# Altium schematic symbol library jlcpcb_2025_04_capacitors_extended_0402.schlib: 3594 symbols (part 11 of 20)
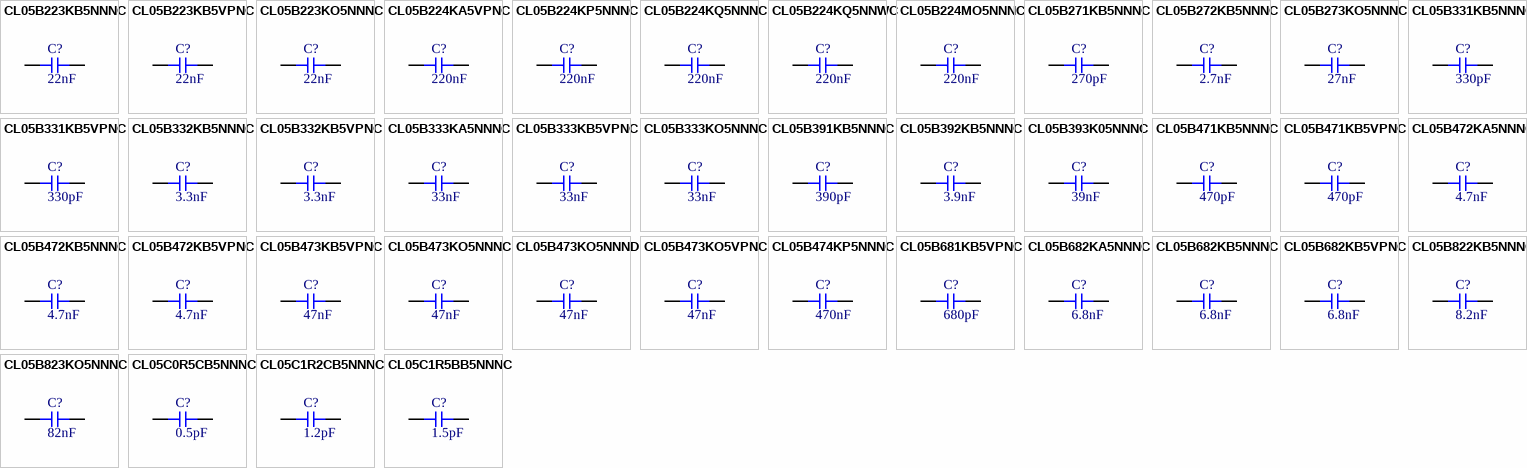
[diagram p99: symbols CL05B223KB5NNNC to CL05C1R5BB5NNNC]

## CL05B472KA5NNNC
designator C?  Capacitance: 4.7nF  (hidden comment: *)
Capacitor, Ceramic (MLCC), 4.7nF, ±10%, 25V, X7R, ±10%, SMD 0402; Manufacturer: Samsung Electro-Mechanics; Manufacturer Part Number: CL05B472KA5NNNC; Package Size: 0402; JLCPCB Basic Part: No; JLCPCB Part Number: C377749; Supplier 1: LCSC; Category: Capacitors - MLCC; Supplier Part Number 1: C377749; Tolerance: ±10%; Voltage Rating: 25V; Temperature Coefficient: X7R; RoHS: Yes; ComponentLink1Description: Datasheet; ComponentLink1URL: https://wmsc.lcsc.com/wmsc/upload/file/pdf/v2/lcsc/2304140030_Samsung-Electro-Mechanics-CL05B472KA5NNNC_C377749.pdf; ComponentLink2Description: JLCPCB Part URL; ComponentLink2URL: https://jlcpcb.com/partdetail/C377749; ComponentLink3Description: LCSC Part URL; ComponentLink3URL: https://lcsc.com/product-detail/Multilayer-Ceramic-Capacitors-MLCC---SMD-SMT_Samsung-Electro-Mechanics-Samsung-Electro-Mechanics-CL05B472KA5NNNC_C377749.html; ComponentLink4Description: Samsung Component Library; ComponentLink4URL: https://weblib.samsungsem.com/mlcc/mlcc-ec.do?partNumber=CL05B472KA5NNN
footprint CAP-0402 (0402 (1005M) Capacitor)
pins: 1, 2

## CL05B472KB5NNNC
designator C?  Capacitance: 4.7nF  (hidden comment: *)
Capacitor, Ceramic (MLCC), 4.7nF, ±10%, 50V, X7R, ±10%, SMD 0402; Manufacturer: Samsung Electro-Mechanics; Manufacturer Part Number: CL05B472KB5NNNC; Package Size: 0402; JLCPCB Basic Part: No; JLCPCB Part Number: C84705; Supplier 1: LCSC; Category: Capacitors - MLCC; Supplier Part Number 1: C84705; Tolerance: ±10%; Voltage Rating: 50V; Temperature Coefficient: X7R; RoHS: Yes; ComponentLink1Description: Datasheet; ComponentLink1URL: https://wmsc.lcsc.com/wmsc/upload/file/pdf/v2/lcsc/2304140030_Samsung-Electro-Mechanics-CL05B472KB5NNNC_C84705.pdf; ComponentLink2Description: JLCPCB Part URL; ComponentLink2URL: https://jlcpcb.com/partdetail/C84705; ComponentLink3Description: LCSC Part URL; ComponentLink3URL: https://lcsc.com/product-detail/Multilayer-Ceramic-Capacitors-MLCC---SMD-SMT_Samsung-Electro-Mechanics-Samsung-Electro-Mechanics-CL05B472KB5NNNC_C84705.html; ComponentLink4Description: Samsung Component Library; ComponentLink4URL: https://weblib.samsungsem.com/mlcc/mlcc-ec.do?partNumber=CL05B472KB5NNN
footprint CAP-0402 (0402 (1005M) Capacitor)
pins: 1, 2

## CL05B472KB5VPNC
designator C?  Capacitance: 4.7nF  (hidden comment: *)
Capacitor, Ceramic (MLCC), 4.7nF, ±10%, 50V, X7R, ±10%, SMD 0402; Manufacturer: Samsung Electro-Mechanics; Manufacturer Part Number: CL05B472KB5VPNC; Package Size: 0402; JLCPCB Basic Part: No; JLCPCB Part Number: C307338; Supplier 1: LCSC; Category: Capacitors - MLCC; Supplier Part Number 1: C307338; Tolerance: ±10%; Voltage Rating: 50V; Temperature Coefficient: X7R; RoHS: Yes; ComponentLink1Description: Datasheet; ComponentLink1URL: https://wmsc.lcsc.com/wmsc/upload/file/pdf/v2/lcsc/2304140030_Samsung-Electro-Mechanics-CL05B472KB5VPNC_C307338.pdf; ComponentLink2Description: JLCPCB Part URL; ComponentLink2URL: https://jlcpcb.com/partdetail/C307338; ComponentLink3Description: LCSC Part URL; ComponentLink3URL: https://lcsc.com/product-detail/Multilayer-Ceramic-Capacitors-MLCC---SMD-SMT_Samsung-Electro-Mechanics-Samsung-Electro-Mechanics-CL05B472KB5VPNC_C307338.html; ComponentLink4Description: Samsung Component Library; ComponentLink4URL: https://weblib.samsungsem.com/mlcc/mlcc-ec.do?partNumber=CL05B472KB5VPN
footprint CAP-0402 (0402 (1005M) Capacitor)
pins: 1, 2

## CL05B473KB5VPNC
designator C?  Capacitance: 47nF  (hidden comment: *)
Capacitor, Ceramic (MLCC), 47nF, ±10%, 50V, X7R, ±10%, SMD 0402; Manufacturer: Samsung Electro-Mechanics; Manufacturer Part Number: CL05B473KB5VPNC; Package Size: 0402; JLCPCB Basic Part: No; JLCPCB Part Number: C307339; Supplier 1: LCSC; Category: Capacitors - MLCC; Supplier Part Number 1: C307339; Tolerance: ±10%; Voltage Rating: 50V; Temperature Coefficient: X7R; RoHS: Yes; ComponentLink1Description: Datasheet; ComponentLink1URL: https://wmsc.lcsc.com/wmsc/upload/file/pdf/v2/lcsc/2304140030_Samsung-Electro-Mechanics-CL05B473KB5VPNC_C307339.pdf; ComponentLink2Description: JLCPCB Part URL; ComponentLink2URL: https://jlcpcb.com/partdetail/C307339; ComponentLink3Description: LCSC Part URL; ComponentLink3URL: https://lcsc.com/product-detail/Multilayer-Ceramic-Capacitors-MLCC---SMD-SMT_Samsung-Electro-Mechanics-Samsung-Electro-Mechanics-CL05B473KB5VPNC_C307339.html; ComponentLink4Description: Samsung Component Library; ComponentLink4URL: https://weblib.samsungsem.com/mlcc/mlcc-ec.do?partNumber=CL05B473KB5VPN
footprint CAP-0402 (0402 (1005M) Capacitor)
pins: 1, 2

## CL05B473KO5NNNC
designator C?  Capacitance: 47nF  (hidden comment: *)
Capacitor, Ceramic (MLCC), 47nF, ±10%, 16V, X7R, ±10%, SMD 0402; Manufacturer: Samsung Electro-Mechanics; Manufacturer Part Number: CL05B473KO5NNNC; Package Size: 0402; JLCPCB Basic Part: No; JLCPCB Part Number: C307434; Supplier 1: LCSC; Category: Capacitors - MLCC; Supplier Part Number 1: C307434; Tolerance: ±10%; Voltage Rating: 16V; Temperature Coefficient: X7R; RoHS: Yes; ComponentLink1Description: Datasheet; ComponentLink1URL: https://wmsc.lcsc.com/wmsc/upload/file/pdf/v2/lcsc/2304140030_Samsung-Electro-Mechanics-CL05B473KO5NNNC_C307434.pdf; ComponentLink2Description: JLCPCB Part URL; ComponentLink2URL: https://jlcpcb.com/partdetail/C307434; ComponentLink3Description: LCSC Part URL; ComponentLink3URL: https://lcsc.com/product-detail/Multilayer-Ceramic-Capacitors-MLCC---SMD-SMT_Samsung-Electro-Mechanics-Samsung-Electro-Mechanics-CL05B473KO5NNNC_C307434.html; ComponentLink4Description: Samsung Component Library; ComponentLink4URL: https://weblib.samsungsem.com/mlcc/mlcc-ec.do?partNumber=CL05B473KO5NNN
footprint CAP-0402 (0402 (1005M) Capacitor)
pins: 1, 2

## CL05B473KO5NNND
designator C?  Capacitance: 47nF  (hidden comment: *)
Capacitor, Ceramic (MLCC), 47nF, ±10%, 16V, X7R, ±10%, SMD 0402; Manufacturer: Samsung Electro-Mechanics; Manufacturer Part Number: CL05B473KO5NNND; Package Size: 0402; JLCPCB Basic Part: No; JLCPCB Part Number: C377750; Supplier 1: LCSC; Category: Capacitors - MLCC; Supplier Part Number 1: C377750; Tolerance: ±10%; Voltage Rating: 16V; Temperature Coefficient: X7R; RoHS: Yes; ComponentLink1Description: Datasheet; ComponentLink1URL: https://wmsc.lcsc.com/wmsc/upload/file/pdf/v2/lcsc/2304140030_Samsung-Electro-Mechanics-CL05B473KO5NNND_C377750.pdf; ComponentLink2Description: JLCPCB Part URL; ComponentLink2URL: https://jlcpcb.com/partdetail/C377750; ComponentLink3Description: LCSC Part URL; ComponentLink3URL: https://lcsc.com/product-detail/Multilayer-Ceramic-Capacitors-MLCC---SMD-SMT_Samsung-Electro-Mechanics-Samsung-Electro-Mechanics-CL05B473KO5NNND_C377750.html; ComponentLink4Description: Samsung Component Library; ComponentLink4URL: https://weblib.samsungsem.com/mlcc/mlcc-ec.do?partNumber=CL05B473KO5NNN
footprint CAP-0402 (0402 (1005M) Capacitor)
pins: 1, 2

## CL05B473KO5VPNC
designator C?  Capacitance: 47nF  (hidden comment: *)
Capacitor, Ceramic (MLCC), 47nF, ±10%, 16V, X7R, ±10%, SMD 0402; Manufacturer: Samsung Electro-Mechanics; Manufacturer Part Number: CL05B473KO5VPNC; Package Size: 0402; JLCPCB Basic Part: No; JLCPCB Part Number: C472440; Supplier 1: LCSC; Category: Capacitors - MLCC; Supplier Part Number 1: C472440; Tolerance: ±10%; Voltage Rating: 16V; Temperature Coefficient: X7R; RoHS: Yes; ComponentLink1Description: Datasheet; ComponentLink1URL: https://wmsc.lcsc.com/wmsc/upload/file/pdf/v2/lcsc/2304140030_Samsung-Electro-Mechanics-CL05B473KO5VPNC_C472440.pdf; ComponentLink2Description: JLCPCB Part URL; ComponentLink2URL: https://jlcpcb.com/partdetail/C472440; ComponentLink3Description: LCSC Part URL; ComponentLink3URL: https://lcsc.com/product-detail/Multilayer-Ceramic-Capacitors-MLCC---SMD-SMT_Samsung-Electro-Mechanics-Samsung-Electro-Mechanics-CL05B473KO5VPNC_C472440.html; ComponentLink4Description: Samsung Component Library; ComponentLink4URL: https://weblib.samsungsem.com/mlcc/mlcc-ec.do?partNumber=CL05B473KO5VPN
footprint CAP-0402 (0402 (1005M) Capacitor)
pins: 1, 2

## CL05B474KP5NNNC
designator C?  Capacitance: 470nF  (hidden comment: *)
Capacitor, Ceramic (MLCC), 470nF, ±10%, 10V, X7R, ±10%, SMD 0402; Manufacturer: Samsung Electro-Mechanics; Manufacturer Part Number: CL05B474KP5NNNC; Package Size: 0402; JLCPCB Basic Part: No; JLCPCB Part Number: C2895720; Supplier 1: LCSC; Category: Capacitors - MLCC; Supplier Part Number 1: C2895720; Tolerance: ±10%; Voltage Rating: 10V; Temperature Coefficient: X7R; RoHS: Yes; ComponentLink1Description: Datasheet; ComponentLink1URL: https://wmsc.lcsc.com/wmsc/upload/file/pdf/v2/lcsc/2202132100_Samsung-Electro-Mechanics-CL05B474KP5NNNC_C2895720.pdf; ComponentLink2Description: JLCPCB Part URL; ComponentLink2URL: https://jlcpcb.com/partdetail/C2895720; ComponentLink3Description: LCSC Part URL; ComponentLink3URL: https://lcsc.com/product-detail/Multilayer-Ceramic-Capacitors-MLCC---SMD-SMT_Samsung-Electro-Mechanics-Samsung-Electro-Mechanics-CL05B474KP5NNNC_C2895720.html; ComponentLink4Description: Samsung Component Library; ComponentLink4URL: https://weblib.samsungsem.com/mlcc/mlcc-ec.do?partNumber=CL05B474KP5NNN
footprint CAP-0402 (0402 (1005M) Capacitor)
pins: 1, 2

## CL05B681KB5VPNC
designator C?  Capacitance: 680pF  (hidden comment: *)
Capacitor, Ceramic (MLCC), 680pF, ±10%, 50V, X7R, ±10%, SMD 0402; Manufacturer: Samsung Electro-Mechanics; Manufacturer Part Number: CL05B681KB5VPNC; Package Size: 0402; JLCPCB Basic Part: No; JLCPCB Part Number: C472441; Supplier 1: LCSC; Category: Capacitors - MLCC; Supplier Part Number 1: C472441; Tolerance: ±10%; Voltage Rating: 50V; Temperature Coefficient: X7R; RoHS: Yes; ComponentLink1Description: Datasheet; ComponentLink1URL: https://wmsc.lcsc.com/wmsc/upload/file/pdf/v2/lcsc/2304140030_Samsung-Electro-Mechanics-CL05B681KB5VPNC_C472441.pdf; ComponentLink2Description: JLCPCB Part URL; ComponentLink2URL: https://jlcpcb.com/partdetail/C472441; ComponentLink3Description: LCSC Part URL; ComponentLink3URL: https://lcsc.com/product-detail/Multilayer-Ceramic-Capacitors-MLCC---SMD-SMT_Samsung-Electro-Mechanics-Samsung-Electro-Mechanics-CL05B681KB5VPNC_C472441.html; ComponentLink4Description: Samsung Component Library; ComponentLink4URL: https://weblib.samsungsem.com/mlcc/mlcc-ec.do?partNumber=CL05B681KB5VPN
footprint CAP-0402 (0402 (1005M) Capacitor)
pins: 1, 2

## CL05B682KA5NNNC
designator C?  Capacitance: 6.8nF  (hidden comment: *)
Capacitor, Ceramic (MLCC), 6.8nF, ±10%, 25V, X7R, ±10%, SMD 0402; Manufacturer: Samsung Electro-Mechanics; Manufacturer Part Number: CL05B682KA5NNNC; Package Size: 0402; JLCPCB Basic Part: No; JLCPCB Part Number: C318630; Supplier 1: LCSC; Category: Capacitors - MLCC; Supplier Part Number 1: C318630; Tolerance: ±10%; Voltage Rating: 25V; Temperature Coefficient: X7R; RoHS: Yes; ComponentLink1Description: Datasheet; ComponentLink1URL: https://wmsc.lcsc.com/wmsc/upload/file/pdf/v2/lcsc/2304140030_Samsung-Electro-Mechanics-CL05B682KA5NNNC_C318630.pdf; ComponentLink2Description: JLCPCB Part URL; ComponentLink2URL: https://jlcpcb.com/partdetail/C318630; ComponentLink3Description: LCSC Part URL; ComponentLink3URL: https://lcsc.com/product-detail/Multilayer-Ceramic-Capacitors-MLCC---SMD-SMT_Samsung-Electro-Mechanics-Samsung-Electro-Mechanics-CL05B682KA5NNNC_C318630.html; ComponentLink4Description: Samsung Component Library; ComponentLink4URL: https://weblib.samsungsem.com/mlcc/mlcc-ec.do?partNumber=CL05B682KA5NNN
footprint CAP-0402 (0402 (1005M) Capacitor)
pins: 1, 2

## CL05B682KB5NNNC
designator C?  Capacitance: 6.8nF  (hidden comment: *)
Capacitor, Ceramic (MLCC), 6.8nF, ±10%, 50V, X7R, ±10%, SMD 0402; Manufacturer: Samsung Electro-Mechanics; Manufacturer Part Number: CL05B682KB5NNNC; Package Size: 0402; JLCPCB Basic Part: No; JLCPCB Part Number: C318580; Supplier 1: LCSC; Category: Capacitors - MLCC; Supplier Part Number 1: C318580; Tolerance: ±10%; Voltage Rating: 50V; Temperature Coefficient: X7R; RoHS: Yes; ComponentLink1Description: Datasheet; ComponentLink1URL: https://wmsc.lcsc.com/wmsc/upload/file/pdf/v2/lcsc/2309061404_Samsung-Electro-Mechanics-CL05B682KB5NNNC_C318580.pdf; ComponentLink2Description: JLCPCB Part URL; ComponentLink2URL: https://jlcpcb.com/partdetail/C318580; ComponentLink3Description: LCSC Part URL; ComponentLink3URL: https://lcsc.com/product-detail/Multilayer-Ceramic-Capacitors-MLCC---SMD-SMT_Samsung-Electro-Mechanics-Samsung-Electro-Mechanics-CL05B682KB5NNNC_C318580.html; ComponentLink4Description: Samsung Component Library; ComponentLink4URL: https://weblib.samsungsem.com/mlcc/mlcc-ec.do?partNumber=CL05B682KB5NNN
footprint CAP-0402 (0402 (1005M) Capacitor)
pins: 1, 2

## CL05B682KB5VPNC
designator C?  Capacitance: 6.8nF  (hidden comment: *)
Capacitor, Ceramic (MLCC), 6.8nF, ±10%, 50V, X7R, ±10%, SMD 0402; Manufacturer: Samsung Electro-Mechanics; Manufacturer Part Number: CL05B682KB5VPNC; Package Size: 0402; JLCPCB Basic Part: No; JLCPCB Part Number: C3840335; Supplier 1: LCSC; Category: Capacitors - MLCC; Supplier Part Number 1: C3840335; Tolerance: ±10%; Voltage Rating: 50V; Temperature Coefficient: X7R; RoHS: Yes; ComponentLink1Description: Datasheet; ComponentLink1URL: https://wmsc.lcsc.com/wmsc/upload/file/pdf/v2/lcsc/2309061135_Samsung-Electro-Mechanics-CL05B682KB5VPNC_C3840335.pdf; ComponentLink2Description: JLCPCB Part URL; ComponentLink2URL: https://jlcpcb.com/partdetail/C3840335; ComponentLink3Description: LCSC Part URL; ComponentLink3URL: https://lcsc.com/product-detail/Multilayer-Ceramic-Capacitors-MLCC---SMD-SMT_Samsung-Electro-Mechanics-Samsung-Electro-Mechanics-CL05B682KB5VPNC_C3840335.html; ComponentLink4Description: Samsung Component Library; ComponentLink4URL: https://weblib.samsungsem.com/mlcc/mlcc-ec.do?partNumber=CL05B682KB5VPN
footprint CAP-0402 (0402 (1005M) Capacitor)
pins: 1, 2

## CL05B822KB5NNNC
designator C?  Capacitance: 8.2nF  (hidden comment: *)
Capacitor, Ceramic (MLCC), 8.2nF, ±10%, 50V, X7R, ±10%, SMD 0402; Manufacturer: Samsung Electro-Mechanics; Manufacturer Part Number: CL05B822KB5NNNC; Package Size: 0402; JLCPCB Basic Part: No; JLCPCB Part Number: C307436; Supplier 1: LCSC; Category: Capacitors - MLCC; Supplier Part Number 1: C307436; Tolerance: ±10%; Voltage Rating: 50V; Temperature Coefficient: X7R; RoHS: Yes; ComponentLink1Description: Datasheet; ComponentLink1URL: https://wmsc.lcsc.com/wmsc/upload/file/pdf/v2/lcsc/2304140030_Samsung-Electro-Mechanics-CL05B822KB5NNNC_C307436.pdf; ComponentLink2Description: JLCPCB Part URL; ComponentLink2URL: https://jlcpcb.com/partdetail/C307436; ComponentLink3Description: LCSC Part URL; ComponentLink3URL: https://lcsc.com/product-detail/Multilayer-Ceramic-Capacitors-MLCC---SMD-SMT_Samsung-Electro-Mechanics-Samsung-Electro-Mechanics-CL05B822KB5NNNC_C307436.html; ComponentLink4Description: Samsung Component Library; ComponentLink4URL: https://weblib.samsungsem.com/mlcc/mlcc-ec.do?partNumber=CL05B822KB5NNN
footprint CAP-0402 (0402 (1005M) Capacitor)
pins: 1, 2

## CL05B823KO5NNNC
designator C?  Capacitance: 82nF  (hidden comment: *)
Capacitor, Ceramic (MLCC), 82nF, ±10%, 16V, X7R, ±10%, SMD 0402; Manufacturer: Samsung Electro-Mechanics; Manufacturer Part Number: CL05B823KO5NNNC; Package Size: 0402; JLCPCB Basic Part: No; JLCPCB Part Number: C307437; Supplier 1: LCSC; Category: Capacitors - MLCC; Supplier Part Number 1: C307437; Tolerance: ±10%; Voltage Rating: 16V; Temperature Coefficient: X7R; RoHS: Yes; ComponentLink1Description: Datasheet; ComponentLink1URL: https://wmsc.lcsc.com/wmsc/upload/file/pdf/v2/lcsc/2304140030_Samsung-Electro-Mechanics-CL05B823KO5NNNC_C307437.pdf; ComponentLink2Description: JLCPCB Part URL; ComponentLink2URL: https://jlcpcb.com/partdetail/C307437; ComponentLink3Description: LCSC Part URL; ComponentLink3URL: https://lcsc.com/product-detail/Multilayer-Ceramic-Capacitors-MLCC---SMD-SMT_Samsung-Electro-Mechanics-Samsung-Electro-Mechanics-CL05B823KO5NNNC_C307437.html; ComponentLink4Description: Samsung Component Library; ComponentLink4URL: https://weblib.samsungsem.com/mlcc/mlcc-ec.do?partNumber=CL05B823KO5NNN
footprint CAP-0402 (0402 (1005M) Capacitor)
pins: 1, 2

## CL05C0R5CB5NNNC
designator C?  Capacitance: 0.5pF  (hidden comment: *)
Capacitor, Ceramic (MLCC), 0.5pF, 50V, C0G, SMD 0402; Manufacturer: Samsung Electro-Mechanics; Manufacturer Part Number: CL05C0R5CB5NNNC; Package Size: 0402; JLCPCB Basic Part: No; JLCPCB Part Number: C86284; Supplier 1: LCSC; Category: Capacitors - MLCC; Supplier Part Number 1: C86284; Voltage Rating: 50V; Temperature Coefficient: C0G; RoHS: Yes; ComponentLink1Description: Datasheet; ComponentLink1URL: https://wmsc.lcsc.com/wmsc/upload/file/pdf/v2/lcsc/2304140030_Samsung-Electro-Mechanics-CL05C0R5CB5NNNC_C86284.pdf; ComponentLink2Description: JLCPCB Part URL; ComponentLink2URL: https://jlcpcb.com/partdetail/C86284; ComponentLink3Description: LCSC Part URL; ComponentLink3URL: https://lcsc.com/product-detail/Multilayer-Ceramic-Capacitors-MLCC---SMD-SMT_Samsung-Electro-Mechanics-Samsung-Electro-Mechanics-CL05C0R5CB5NNNC_C86284.html; ComponentLink4Description: Samsung Component Library; ComponentLink4URL: https://weblib.samsungsem.com/mlcc/mlcc-ec.do?partNumber=CL05C0R5CB5NNN
footprint CAP-0402 (0402 (1005M) Capacitor)
pins: 1, 2

## CL05C1R2CB5NNNC
designator C?  Capacitance: 1.2pF  (hidden comment: *)
Capacitor, Ceramic (MLCC), 1.2pF, 50V, C0G, SMD 0402; Manufacturer: Samsung Electro-Mechanics; Manufacturer Part Number: CL05C1R2CB5NNNC; Package Size: 0402; JLCPCB Basic Part: No; JLCPCB Part Number: C159808; Supplier 1: LCSC; Category: Capacitors - MLCC; Supplier Part Number 1: C159808; Voltage Rating: 50V; Temperature Coefficient: C0G; RoHS: Yes; ComponentLink1Description: Datasheet; ComponentLink1URL: https://wmsc.lcsc.com/wmsc/upload/file/pdf/v2/lcsc/2304140030_Samsung-Electro-Mechanics-CL05C1R2CB5NNNC_C159808.pdf; ComponentLink2Description: JLCPCB Part URL; ComponentLink2URL: https://jlcpcb.com/partdetail/C159808; ComponentLink3Description: LCSC Part URL; ComponentLink3URL: https://lcsc.com/product-detail/Multilayer-Ceramic-Capacitors-MLCC---SMD-SMT_Samsung-Electro-Mechanics-Samsung-Electro-Mechanics-CL05C1R2CB5NNNC_C159808.html; ComponentLink4Description: Samsung Component Library; ComponentLink4URL: https://weblib.samsungsem.com/mlcc/mlcc-ec.do?partNumber=CL05C1R2CB5NNN
footprint CAP-0402 (0402 (1005M) Capacitor)
pins: 1, 2

## CL05C1R5BB5NNNC
designator C?  Capacitance: 1.5pF  (hidden comment: *)
Capacitor, Ceramic (MLCC), 1.5pF, 50V, C0G, SMD 0402; Manufacturer: Samsung Electro-Mechanics; Manufacturer Part Number: CL05C1R5BB5NNNC; Package Size: 0402; JLCPCB Basic Part: No; JLCPCB Part Number: C2980160; Supplier 1: LCSC; Category: Capacitors - MLCC; Supplier Part Number 1: C2980160; Voltage Rating: 50V; Temperature Coefficient: C0G; RoHS: Yes; ComponentLink1Description: Datasheet; ComponentLink1URL: https://wmsc.lcsc.com/wmsc/upload/file/pdf/v2/lcsc/2203081130_Samsung-Electro-Mechanics-CL05C1R5BB5NNNC_C2980160.pdf; ComponentLink2Description: JLCPCB Part URL; ComponentLink2URL: https://jlcpcb.com/partdetail/C2980160; ComponentLink3Description: LCSC Part URL; ComponentLink3URL: https://lcsc.com/product-detail/Multilayer-Ceramic-Capacitors-MLCC---SMD-SMT_Samsung-Electro-Mechanics-Samsung-Electro-Mechanics-CL05C1R5BB5NNNC_C2980160.html; ComponentLink4Description: Samsung Component Library; ComponentLink4URL: https://weblib.samsungsem.com/mlcc/mlcc-ec.do?partNumber=CL05C1R5BB5NNN
footprint CAP-0402 (0402 (1005M) Capacitor)
pins: 1, 2

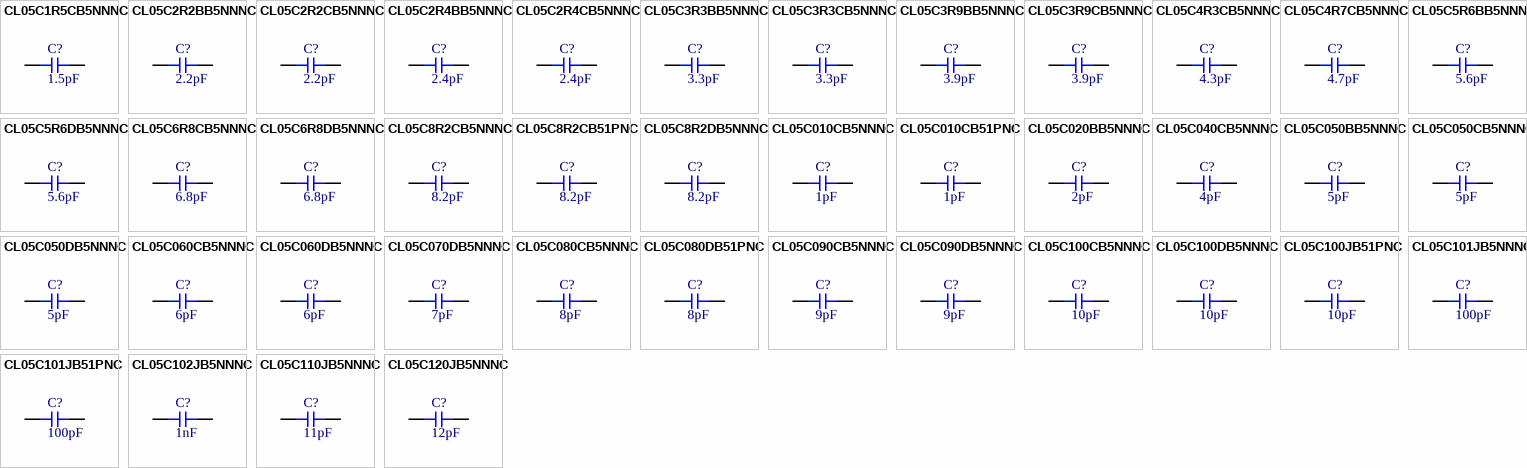
[diagram p47: symbols CL05C1R5CB5NNNC to CL05C120JB5NNNC]

## CL05C1R5CB5NNNC
designator C?  Capacitance: 1.5pF  (hidden comment: *)
Capacitor, Ceramic (MLCC), 1.5pF, 50V, C0G, SMD 0402; Manufacturer: Samsung Electro-Mechanics; Manufacturer Part Number: CL05C1R5CB5NNNC; Package Size: 0402; JLCPCB Basic Part: No; JLCPCB Part Number: C170150; Supplier 1: LCSC; Category: Capacitors - MLCC; Supplier Part Number 1: C170150; Voltage Rating: 50V; Temperature Coefficient: C0G; RoHS: Yes; ComponentLink1Description: Datasheet; ComponentLink1URL: https://wmsc.lcsc.com/wmsc/upload/file/pdf/v2/lcsc/2304140030_Samsung-Electro-Mechanics-CL05C1R5CB5NNNC_C170150.pdf; ComponentLink2Description: JLCPCB Part URL; ComponentLink2URL: https://jlcpcb.com/partdetail/C170150; ComponentLink3Description: LCSC Part URL; ComponentLink3URL: https://lcsc.com/product-detail/Multilayer-Ceramic-Capacitors-MLCC---SMD-SMT_Samsung-Electro-Mechanics-Samsung-Electro-Mechanics-CL05C1R5CB5NNNC_C170150.html; ComponentLink4Description: Samsung Component Library; ComponentLink4URL: https://weblib.samsungsem.com/mlcc/mlcc-ec.do?partNumber=CL05C1R5CB5NNN
footprint CAP-0402 (0402 (1005M) Capacitor)
pins: 1, 2

## CL05C2R2BB5NNNC
designator C?  Capacitance: 2.2pF  (hidden comment: *)
Capacitor, Ceramic (MLCC), 2.2pF, 50V, C0G, SMD 0402; Manufacturer: Samsung Electro-Mechanics; Manufacturer Part Number: CL05C2R2BB5NNNC; Package Size: 0402; JLCPCB Basic Part: No; JLCPCB Part Number: C307446; Supplier 1: LCSC; Category: Capacitors - MLCC; Supplier Part Number 1: C307446; Voltage Rating: 50V; Temperature Coefficient: C0G; RoHS: Yes; ComponentLink1Description: Datasheet; ComponentLink2Description: JLCPCB Part URL; ComponentLink2URL: https://jlcpcb.com/partdetail/C307446; ComponentLink3Description: LCSC Part URL; ComponentLink3URL: https://lcsc.com/product-detail/Multilayer-Ceramic-Capacitors-MLCC---SMD-SMT_Samsung-Electro-Mechanics-Samsung-Electro-Mechanics-CL05C2R2BB5NNNC_C307446.html; ComponentLink4Description: Samsung Component Library; ComponentLink4URL: https://weblib.samsungsem.com/mlcc/mlcc-ec.do?partNumber=CL05C2R2BB5NNN
footprint CAP-0402 (0402 (1005M) Capacitor)
pins: 1, 2

## CL05C2R2CB5NNNC
designator C?  Capacitance: 2.2pF  (hidden comment: *)
Capacitor, Ceramic (MLCC), 2.2pF, 50V, C0G, SMD 0402; Manufacturer: Samsung Electro-Mechanics; Manufacturer Part Number: CL05C2R2CB5NNNC; Package Size: 0402; JLCPCB Basic Part: No; JLCPCB Part Number: C159806; Supplier 1: LCSC; Category: Capacitors - MLCC; Supplier Part Number 1: C159806; Voltage Rating: 50V; Temperature Coefficient: C0G; RoHS: Yes; ComponentLink1Description: Datasheet; ComponentLink1URL: https://wmsc.lcsc.com/wmsc/upload/file/pdf/v2/lcsc/2304140030_Samsung-Electro-Mechanics-CL05C2R2CB5NNNC_C159806.pdf; ComponentLink2Description: JLCPCB Part URL; ComponentLink2URL: https://jlcpcb.com/partdetail/C159806; ComponentLink3Description: LCSC Part URL; ComponentLink3URL: https://lcsc.com/product-detail/Multilayer-Ceramic-Capacitors-MLCC---SMD-SMT_Samsung-Electro-Mechanics-Samsung-Electro-Mechanics-CL05C2R2CB5NNNC_C159806.html; ComponentLink4Description: Samsung Component Library; ComponentLink4URL: https://weblib.samsungsem.com/mlcc/mlcc-ec.do?partNumber=CL05C2R2CB5NNN
footprint CAP-0402 (0402 (1005M) Capacitor)
pins: 1, 2

## CL05C2R4BB5NNNC
designator C?  Capacitance: 2.4pF  (hidden comment: *)
Capacitor, Ceramic (MLCC), 2.4pF, 50V, C0G, SMD 0402; Manufacturer: Samsung Electro-Mechanics; Manufacturer Part Number: CL05C2R4BB5NNNC; Package Size: 0402; JLCPCB Basic Part: No; JLCPCB Part Number: C377751; Supplier 1: LCSC; Category: Capacitors - MLCC; Supplier Part Number 1: C377751; Voltage Rating: 50V; Temperature Coefficient: C0G; RoHS: Yes; ComponentLink1Description: Datasheet; ComponentLink1URL: https://wmsc.lcsc.com/wmsc/upload/file/pdf/v2/lcsc/2304140030_Samsung-Electro-Mechanics-CL05C2R4BB5NNNC_C377751.pdf; ComponentLink2Description: JLCPCB Part URL; ComponentLink2URL: https://jlcpcb.com/partdetail/C377751; ComponentLink3Description: LCSC Part URL; ComponentLink3URL: https://lcsc.com/product-detail/Multilayer-Ceramic-Capacitors-MLCC---SMD-SMT_Samsung-Electro-Mechanics-Samsung-Electro-Mechanics-CL05C2R4BB5NNNC_C377751.html; ComponentLink4Description: Samsung Component Library; ComponentLink4URL: https://weblib.samsungsem.com/mlcc/mlcc-ec.do?partNumber=CL05C2R4BB5NNN
footprint CAP-0402 (0402 (1005M) Capacitor)
pins: 1, 2

## CL05C2R4CB5NNNC
designator C?  Capacitance: 2.4pF  (hidden comment: *)
Capacitor, Ceramic (MLCC), 2.4pF, 50V, C0G, SMD 0402; Manufacturer: Samsung Electro-Mechanics; Manufacturer Part Number: CL05C2R4CB5NNNC; Package Size: 0402; JLCPCB Basic Part: No; JLCPCB Part Number: C318575; Supplier 1: LCSC; Category: Capacitors - MLCC; Supplier Part Number 1: C318575; Voltage Rating: 50V; Temperature Coefficient: C0G; RoHS: Yes; ComponentLink1Description: Datasheet; ComponentLink1URL: https://wmsc.lcsc.com/wmsc/upload/file/pdf/v2/lcsc/2304140030_Samsung-Electro-Mechanics-CL05C2R4CB5NNNC_C318575.pdf; ComponentLink2Description: JLCPCB Part URL; ComponentLink2URL: https://jlcpcb.com/partdetail/C318575; ComponentLink3Description: LCSC Part URL; ComponentLink3URL: https://lcsc.com/product-detail/Multilayer-Ceramic-Capacitors-MLCC---SMD-SMT_Samsung-Electro-Mechanics-Samsung-Electro-Mechanics-CL05C2R4CB5NNNC_C318575.html; ComponentLink4Description: Samsung Component Library; ComponentLink4URL: https://weblib.samsungsem.com/mlcc/mlcc-ec.do?partNumber=CL05C2R4CB5NNN
footprint CAP-0402 (0402 (1005M) Capacitor)
pins: 1, 2

## CL05C3R3BB5NNNC
designator C?  Capacitance: 3.3pF  (hidden comment: *)
Capacitor, Ceramic (MLCC), 3.3pF, 50V, C0G, SMD 0402; Manufacturer: Samsung Electro-Mechanics; Manufacturer Part Number: CL05C3R3BB5NNNC; Package Size: 0402; JLCPCB Basic Part: No; JLCPCB Part Number: C318572; Supplier 1: LCSC; Category: Capacitors - MLCC; Supplier Part Number 1: C318572; Voltage Rating: 50V; Temperature Coefficient: C0G; RoHS: Yes; ComponentLink1Description: Datasheet; ComponentLink1URL: https://wmsc.lcsc.com/wmsc/upload/file/pdf/v2/lcsc/2304140030_Samsung-Electro-Mechanics-CL05C3R3BB5NNNC_C318572.pdf; ComponentLink2Description: JLCPCB Part URL; ComponentLink2URL: https://jlcpcb.com/partdetail/C318572; ComponentLink3Description: LCSC Part URL; ComponentLink3URL: https://lcsc.com/product-detail/Multilayer-Ceramic-Capacitors-MLCC---SMD-SMT_Samsung-Electro-Mechanics-Samsung-Electro-Mechanics-CL05C3R3BB5NNNC_C318572.html; ComponentLink4Description: Samsung Component Library; ComponentLink4URL: https://weblib.samsungsem.com/mlcc/mlcc-ec.do?partNumber=CL05C3R3BB5NNN
footprint CAP-0402 (0402 (1005M) Capacitor)
pins: 1, 2

## CL05C3R3CB5NNNC
designator C?  Capacitance: 3.3pF  (hidden comment: *)
Capacitor, Ceramic (MLCC), 3.3pF, 50V, C0G, SMD 0402; Manufacturer: Samsung Electro-Mechanics; Manufacturer Part Number: CL05C3R3CB5NNNC; Package Size: 0402; JLCPCB Basic Part: No; JLCPCB Part Number: C307447; Supplier 1: LCSC; Category: Capacitors - MLCC; Supplier Part Number 1: C307447; Voltage Rating: 50V; Temperature Coefficient: C0G; RoHS: Yes; ComponentLink1Description: Datasheet; ComponentLink1URL: https://wmsc.lcsc.com/wmsc/upload/file/pdf/v2/lcsc/2304140030_Samsung-Electro-Mechanics-CL05C3R3CB5NNNC_C307447.pdf; ComponentLink2Description: JLCPCB Part URL; ComponentLink2URL: https://jlcpcb.com/partdetail/C307447; ComponentLink3Description: LCSC Part URL; ComponentLink3URL: https://lcsc.com/product-detail/Multilayer-Ceramic-Capacitors-MLCC---SMD-SMT_Samsung-Electro-Mechanics-Samsung-Electro-Mechanics-CL05C3R3CB5NNNC_C307447.html; ComponentLink4Description: Samsung Component Library; ComponentLink4URL: https://weblib.samsungsem.com/mlcc/mlcc-ec.do?partNumber=CL05C3R3CB5NNN
footprint CAP-0402 (0402 (1005M) Capacitor)
pins: 1, 2

## CL05C3R9BB5NNNC
designator C?  Capacitance: 3.9pF  (hidden comment: *)
Capacitor, Ceramic (MLCC), 3.9pF, 50V, C0G, SMD 0402; Manufacturer: Samsung Electro-Mechanics; Manufacturer Part Number: CL05C3R9BB5NNNC; Package Size: 0402; JLCPCB Basic Part: No; JLCPCB Part Number: C318608; Supplier 1: LCSC; Category: Capacitors - MLCC; Supplier Part Number 1: C318608; Voltage Rating: 50V; Temperature Coefficient: C0G; RoHS: Yes; ComponentLink1Description: Datasheet; ComponentLink1URL: https://wmsc.lcsc.com/wmsc/upload/file/pdf/v2/lcsc/2304140030_Samsung-Electro-Mechanics-CL05C3R9BB5NNNC_C318608.pdf; ComponentLink2Description: JLCPCB Part URL; ComponentLink2URL: https://jlcpcb.com/partdetail/C318608; ComponentLink3Description: LCSC Part URL; ComponentLink3URL: https://lcsc.com/product-detail/Multilayer-Ceramic-Capacitors-MLCC---SMD-SMT_Samsung-Electro-Mechanics-Samsung-Electro-Mechanics-CL05C3R9BB5NNNC_C318608.html; ComponentLink4Description: Samsung Component Library; ComponentLink4URL: https://weblib.samsungsem.com/mlcc/mlcc-ec.do?partNumber=CL05C3R9BB5NNN
footprint CAP-0402 (0402 (1005M) Capacitor)
pins: 1, 2

## CL05C3R9CB5NNNC
designator C?  Capacitance: 3.9pF  (hidden comment: *)
Capacitor, Ceramic (MLCC), 3.9pF, 50V, C0G, SMD 0402; Manufacturer: Samsung Electro-Mechanics; Manufacturer Part Number: CL05C3R9CB5NNNC; Package Size: 0402; JLCPCB Basic Part: No; JLCPCB Part Number: C48151; Supplier 1: LCSC; Category: Capacitors - MLCC; Supplier Part Number 1: C48151; Voltage Rating: 50V; Temperature Coefficient: C0G; RoHS: Yes; ComponentLink1Description: Datasheet; ComponentLink1URL: https://wmsc.lcsc.com/wmsc/upload/file/pdf/v2/lcsc/2304140030_Samsung-Electro-Mechanics-CL05C3R9CB5NNNC_C48151.pdf; ComponentLink2Description: JLCPCB Part URL; ComponentLink2URL: https://jlcpcb.com/partdetail/C48151; ComponentLink3Description: LCSC Part URL; ComponentLink3URL: https://lcsc.com/product-detail/Multilayer-Ceramic-Capacitors-MLCC---SMD-SMT_Samsung-Electro-Mechanics-Samsung-Electro-Mechanics-CL05C3R9CB5NNNC_C48151.html; ComponentLink4Description: Samsung Component Library; ComponentLink4URL: https://weblib.samsungsem.com/mlcc/mlcc-ec.do?partNumber=CL05C3R9CB5NNN
footprint CAP-0402 (0402 (1005M) Capacitor)
pins: 1, 2

## CL05C4R3CB5NNNC
designator C?  Capacitance: 4.3pF  (hidden comment: *)
Capacitor, Ceramic (MLCC), 4.3pF, 50V, C0G, SMD 0402; Manufacturer: Samsung Electro-Mechanics; Manufacturer Part Number: CL05C4R3CB5NNNC; Package Size: 0402; JLCPCB Basic Part: No; JLCPCB Part Number: C159803; Supplier 1: LCSC; Category: Capacitors - MLCC; Supplier Part Number 1: C159803; Voltage Rating: 50V; Temperature Coefficient: C0G; RoHS: Yes; ComponentLink1Description: Datasheet; ComponentLink1URL: https://wmsc.lcsc.com/wmsc/upload/file/pdf/v2/lcsc/2304140030_Samsung-Electro-Mechanics-CL05C4R3CB5NNNC_C159803.pdf; ComponentLink2Description: JLCPCB Part URL; ComponentLink2URL: https://jlcpcb.com/partdetail/C159803; ComponentLink3Description: LCSC Part URL; ComponentLink3URL: https://lcsc.com/product-detail/Multilayer-Ceramic-Capacitors-MLCC---SMD-SMT_Samsung-Electro-Mechanics-Samsung-Electro-Mechanics-CL05C4R3CB5NNNC_C159803.html; ComponentLink4Description: Samsung Component Library; ComponentLink4URL: https://weblib.samsungsem.com/mlcc/mlcc-ec.do?partNumber=CL05C4R3CB5NNN
footprint CAP-0402 (0402 (1005M) Capacitor)
pins: 1, 2

## CL05C4R7CB5NNNC
designator C?  Capacitance: 4.7pF  (hidden comment: *)
Capacitor, Ceramic (MLCC), 4.7pF, 50V, C0G, SMD 0402; Manufacturer: Samsung Electro-Mechanics; Manufacturer Part Number: CL05C4R7CB5NNNC; Package Size: 0402; JLCPCB Basic Part: No; JLCPCB Part Number: C318595; Supplier 1: LCSC; Category: Capacitors - MLCC; Supplier Part Number 1: C318595; Voltage Rating: 50V; Temperature Coefficient: C0G; RoHS: Yes; ComponentLink1Description: Datasheet; ComponentLink1URL: https://wmsc.lcsc.com/wmsc/upload/file/pdf/v2/lcsc/2304140030_Samsung-Electro-Mechanics-CL05C4R7CB5NNNC_C318595.pdf; ComponentLink2Description: JLCPCB Part URL; ComponentLink2URL: https://jlcpcb.com/partdetail/C318595; ComponentLink3Description: LCSC Part URL; ComponentLink3URL: https://lcsc.com/product-detail/Multilayer-Ceramic-Capacitors-MLCC---SMD-SMT_Samsung-Electro-Mechanics-Samsung-Electro-Mechanics-CL05C4R7CB5NNNC_C318595.html; ComponentLink4Description: Samsung Component Library; ComponentLink4URL: https://weblib.samsungsem.com/mlcc/mlcc-ec.do?partNumber=CL05C4R7CB5NNN
footprint CAP-0402 (0402 (1005M) Capacitor)
pins: 1, 2
